# Altium footprint library FlyControl.PcbLib: 23 footprints (part 2 of 2)
Each footprint in its own frame and in the unit in brackets; x right, y up, seen from the top. Pads: shape width x height; smd on the part's side, far side on the other; paste and mask are expansions set on the pad; w line width, h text height; cw(c..) or ccw(c..) is an arc to the next point about the centre after c.
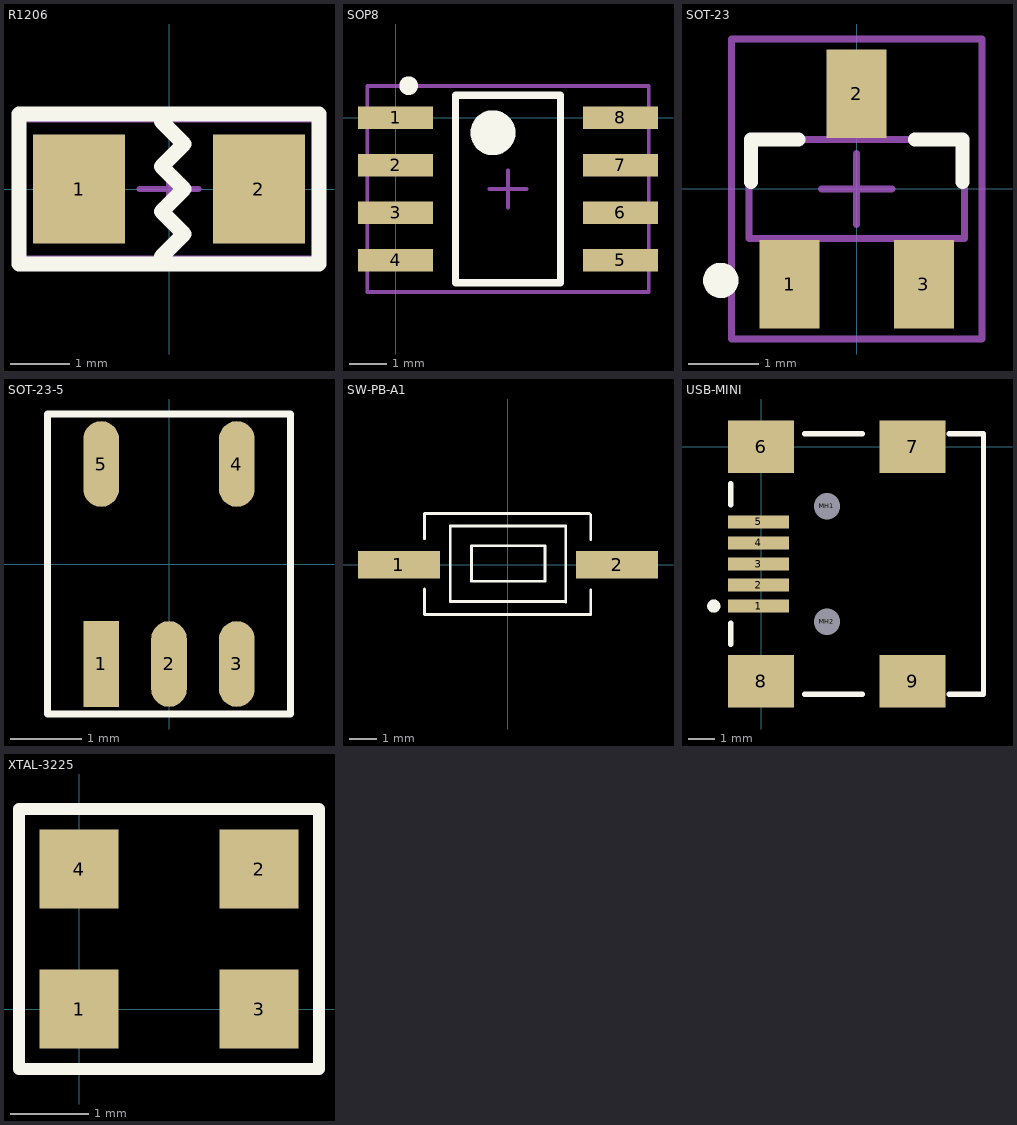
[diagram p1: the footprints below, top view; thin cyan lines are the x and y axes]

## R1206 [mm]
pads (2):
  rect 1.55x1.85 smd: 1(-1.524,0) 2(1.524,0)
Top Overlay:
  lines w0.254: -0.127,-1.143 0.254,-0.762 -0.127,-0.381 0.254,0 -0.127,0.381 0.254,0.762 -0.127,1.143 ; -2.54,-1.27 -2.54,1.27 0.508,1.27 2.54,1.27 2.54,-1.27 0.508,-1.27 -2.54,-1.27
Mechanical 15:
  lines w0.1: -0.5,0 0.5,0 ; 0,-0.5 0,0.5 ; -2.54,-1.175 -2.54,1.175 2.54,1.175 2.54,-1.175 -2.54,-1.175
3D body: height 1, standoff -0.01, extent -1.6,-0.813 1.6,0.797

## SOP8 [mm]
pads (8):
  rect 2x0.6 smd: 1(0,0) 2(0,-1.27) 3(0,-2.54) 4(0,-3.81) 5(6,-3.81) 6(6,-2.54) 7(6,-1.27) 8(6,0)
Top Overlay:
  circle w0.25: c0.35,0.85 r0.125
  circle w0.6: c2.6,-0.405 r0.3
  lines w0.2: 1.6,-4.405 1.6,0.595 4.4,0.595 4.4,-4.405 1.6,-4.405
Mechanical 15:
  lines w0.1: 2.5,-1.905 3.5,-1.905 ; 3,-2.405 3,-1.405 ; -0.75,-4.655 -0.75,0.845 6.75,0.845 6.75,-4.655 -0.75,-4.655
3D body: height 1.51, standoff 0, extent -0.05,-4.343 6.05,0.557

## SOT-23 [mm]
pads (3):
  rect 0.85x1.25 smd: 1(-0.95,-1.35) 2(0,1.35) 3(0.95,-1.35)
Top Overlay:
  circle w0.25: c-1.925,-1.295 r0.125
  lines w0.2: -1.5,0.1 -1.5,0.7 -0.825,0.7 ; 0.825,0.7 1.5,0.7 1.5,0.1
Mechanical 13:
  lines w0.1: -1.525,-0.7 -1.525,0.7 1.525,0.7 1.525,-0.7 -1.525,-0.7
Mechanical 15:
  lines w0.1: -0.5,0 0.5,0 ; 0,-0.5 0,0.5 ; -1.775,-2.125 -1.775,2.125 1.775,2.125 1.775,-2.125 -1.775,-2.125
3D body: height 1.04, standoff -0.03, extent -1.447,-1.124 1.473,1.174

## SOT-23-5 [mm]
pads (5):
  rect 0.5x1.2 smd: 1(-0.95,-1.4)
  oval 0.5x1.2 smd: 2(0,-1.4) 3(0.95,-1.4) 4(0.95,1.4) 5(-0.95,1.4)
Top Overlay:
  lines w0.1: -1.7,-2.1 -1.7,2.1 1.7,2.1 1.7,-2.1 -1.7,-2.1
3D body: height -0.8, standoff -2, extent -1.437,-1.327 1.463,1.473

## SW-PB-A1 [mm]
pads (2):
  rect 3x1 smd: 1(-4,0) 2(4,0)
Top Overlay:
  lines w0.1: -3.064,-1.829 3.036,-1.829 3.036,-0.914 ; -3.06,-1.82 -3.06,-0.895 ; -3.06,0.955 -3.06,1.88 2.985,1.88 3.036,1.829 3.036,0.914 ; 1.359,0.644 1.359,-0.61 -1.341,-0.61 -1.341,0.69 1.359,0.69 ; -2.12,-1.346 -2.12,1.422 2.121,1.422 2.121,-1.372 2.096,-1.346 -2.12,-1.346
3D body: height 2.5, standoff 0, extent -3.92,-1.854 3.97,1.996

## USB-MINI [mm]
pads (11):
  rect 2.3x0.5 smd: 1(-0.1,-6.05) 2(-0.1,-5.25) 3(-0.1,-4.45) 4(-0.1,-3.65) 5(-0.1,-2.85)
  rect 2.5x2 smd: 6(0,0) 7(5.754,0) 8(0,-8.9) 9(5.754,-8.9)
  round 0.6 hole 1 unplated: MH1(2.5,-2.25) MH2(2.5,-6.65)
Top Overlay:
  circle w0.25: c-1.8,-6.05 r0.125
  lines w0.2: -1.15,-7.5 -1.15,-6.7 ; -1.15,-2.2 -1.15,-1.4 ; 1.65,-9.4 3.85,-9.4 ; 1.65,0.5 3.85,0.5 ; 7.15,-9.4 8.45,-9.4 8.45,0.5 7.15,0.5
3D body: height 3.95, standoff -1, extent -0.633,-9.795 8.567,0.905

## XTAL-3225 [mm]
pads (4):
  rect 1x1 smd: 1(0,0) 2(2.286,1.778) 3(2.286,0) 4(0,1.778)
Top Overlay:
  lines w0.152: -0.762,-0.762 -0.762,2.54 3.048,2.54 3.048,-0.762 -0.762,-0.762
3D body: height 0.76, standoff 0, extent -0.602,-0.602 2.888,2.38